# Altium integrated library TerminalBlocksPluggable_5.08mm.IntLib: 266 symbols (part 2 of 2)
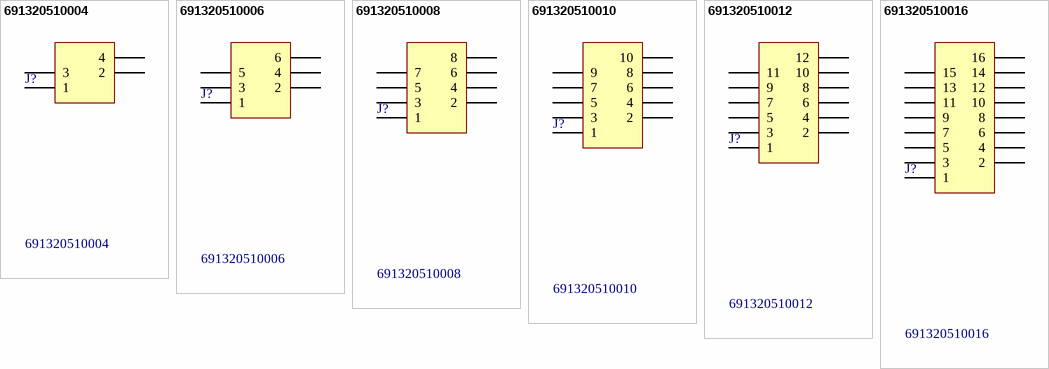
[diagram p25: symbols 691320510004 to 691320510016]

## 691320510012
designator J?
WR-TBL Terminal Blocks Serie 3205 - 5.08 mm with Flanges & Nut Type; Manufacturer: Würth Elektronik eiSos GmbH; ComponentLink1 Description: Manufacturer; ComponentLink2 Description: Datasheet; NoPins: 12; Created Date: 09 April 2014; partNo: 691320510012; ComponentLink1URL: http://www.we-online.com; ComponentLink2URL: http://katalog.we-online.de/em/datasheet/6913205100xx.pdf; Created by: Karrer Zheng; Value: 691320510012
footprint 691320510012 (5,08mm - PCB - Dual row - Staggered - Horizontal - Flanges - 12p)
pins: 1, 2, 3, 4, 5, 6, 7, 8, 9, 10, 11, 12

## 691320510016
designator J?
WR-TBL Terminal Blocks Serie 3205 - 5.08 mm with Flanges & Nut Type; Manufacturer: Würth Elektronik eiSos GmbH; ComponentLink1 Description: Manufacturer; ComponentLink2 Description: Datasheet; NoPins: 16; Created Date: 09 April 2014; partNo: 691320510016; ComponentLink1URL: http://www.we-online.com; ComponentLink2URL: http://katalog.we-online.de/em/datasheet/6913205100xx.pdf; Created by: Karrer Zheng; Value: 691320510016
footprint 691320510016 (5,08mm - PCB - Dual row - Staggered - Horizontal - Flanges - 16p)
pins: 1, 2, 3, 4, 5, 6, 7, 8, 9, 10, 11, 12, 13, 14, 15, 16


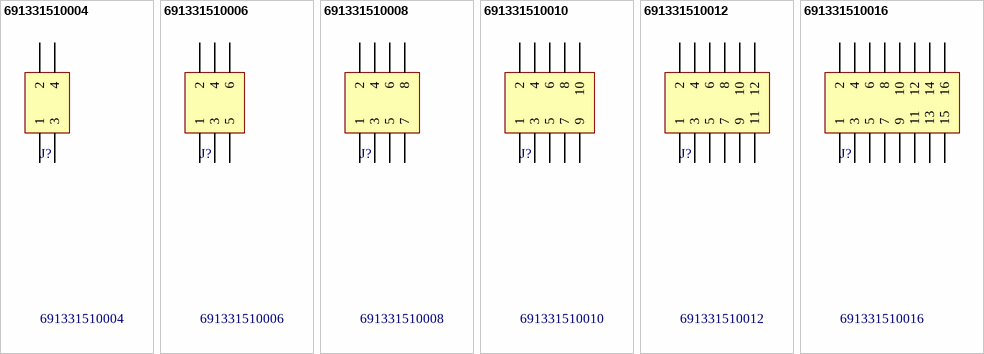
[diagram p11: symbols 691331510004 to 691331510016]

## 691331510004
designator J?
WR-TBL Terminal Blocks Serie 3315 - 5.08 mm; Manufacturer: Würth Elektronik eiSos GmbH; ComponentLink1 Description: Manufacturer; ComponentLink2 Description: Datasheet; NoPins: 04; Created Date: 31 March 2014; partNo: 691331510004; ComponentLink1URL: http://www.we-online.com; ComponentLink2URL: http://katalog.we-online.de/em/datasheet/6913315100xx.pdf; Created by: Karrer Zheng; Value: 691331510004
footprint 691331510004 (5,08mm - PCB - Dual row - Horizontal - 04p)
pins: 1, 2, 3, 4

## 691331510006
designator J?
WR-TBL Terminal Blocks Serie 3315 - 5.08 mm; Manufacturer: Würth Elektronik eiSos GmbH; ComponentLink1 Description: Manufacturer; ComponentLink2 Description: Datasheet; NoPins: 06; Created Date: 31 March 2014; partNo: 691331510006; ComponentLink1URL: http://www.we-online.com; ComponentLink2URL: http://katalog.we-online.de/em/datasheet/6913315100xx.pdf; Created by: Karrer Zheng; Value: 691331510006
footprint 691331510006 (5,08mm - PCB - Dual row - Horizontal - 06p)
pins: 1, 2, 3, 4, 5, 6

## 691331510008
designator J?
WR-TBL Terminal Blocks Serie 3315 - 5.08 mm; Manufacturer: Würth Elektronik eiSos GmbH; ComponentLink1 Description: Manufacturer; ComponentLink2 Description: Datasheet; NoPins: 08; Created Date: 31 March 2014; partNo: 691331510008; ComponentLink1URL: http://www.we-online.com; ComponentLink2URL: http://katalog.we-online.de/em/datasheet/6913315100xx.pdf; Created by: Karrer Zheng; Value: 691331510008
footprint 691331510008 (5,08mm - PCB - Dual row - Horizontal - 08p)
pins: 1, 2, 3, 4, 5, 6, 7, 8

## 691331510010
designator J?
WR-TBL Terminal Blocks Serie 3315 - 5.08 mm; Manufacturer: Würth Elektronik eiSos GmbH; ComponentLink1 Description: Manufacturer; ComponentLink2 Description: Datasheet; NoPins: 10; Created Date: 31 March 2014; partNo: 691331510010; ComponentLink1URL: http://www.we-online.com; ComponentLink2URL: http://katalog.we-online.de/em/datasheet/6913315100xx.pdf; Created by: Karrer Zheng; Value: 691331510010
footprint 691331510010 (5,08mm - PCB - Dual row - Horizontal - 10p)
pins: 1, 2, 3, 4, 5, 6, 7, 8, 9, 10

## 691331510012
designator J?
WR-TBL Terminal Blocks Serie 3315 - 5.08 mm; Manufacturer: Würth Elektronik eiSos GmbH; ComponentLink1 Description: Manufacturer; ComponentLink2 Description: Datasheet; NoPins: 12; Created Date: 31 March 2014; partNo: 691331510012; ComponentLink1URL: http://www.we-online.com; ComponentLink2URL: http://katalog.we-online.de/em/datasheet/6913315100xx.pdf; Created by: Karrer Zheng; Value: 691331510012
footprint 691331510012 (5,08mm - PCB - Dual row - Horizontal - 12p)
pins: 1, 2, 3, 4, 5, 6, 7, 8, 9, 10, 11, 12

## 691331510016
designator J?
WR-TBL Terminal Blocks Serie 3315 - 5.08 mm; Manufacturer: Würth Elektronik eiSos GmbH; ComponentLink1 Description: Manufacturer; ComponentLink2 Description: Datasheet; NoPins: 16; Created Date: 31 March 2014; partNo: 691331510016; ComponentLink1URL: http://www.we-online.com; ComponentLink2URL: http://katalog.we-online.de/em/datasheet/6913315100xx.pdf; Created by: Karrer Zheng; Value: 691331510016
footprint 691331510016 (5,08mm - PCB - Dual row - Horizontal - 16p)
pins: 1, 2, 3, 4, 5, 6, 7, 8, 9, 10, 11, 12, 13, 14, 15, 16


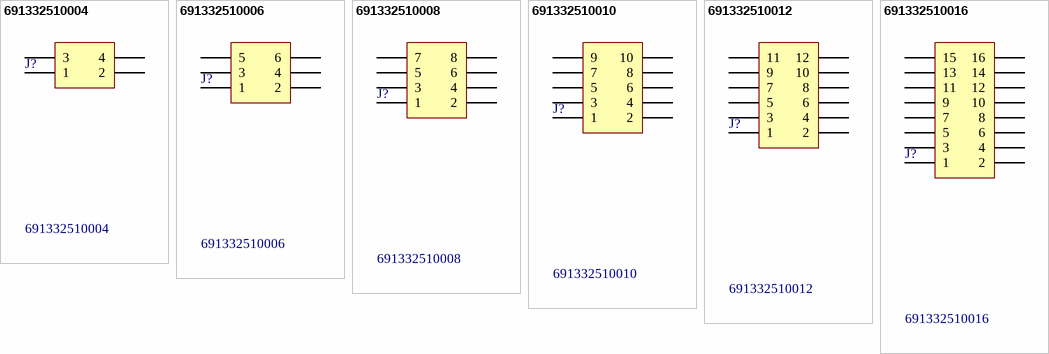
[diagram p12: symbols 691332510004 to 691332510016]

## 691332510004
designator J?
WR-TBL Terminal Blocks Serie 3325 - 5.08 mm with Flanges & Nut Type; Manufacturer: Würth Elektronik eiSos GmbH; ComponentLink1 Description: Manufacturer; ComponentLink2 Description: Datasheet; NoPins: 04; Created Date: 09 April 2014; partNo: 691332510004; ComponentLink1URL: http://www.we-online.com; ComponentLink2URL: http://katalog.we-online.de/em/datasheet/6913325100xx.pdf; Created by: Karrer Zheng; Value: 691332510004
footprint 691332510004 (5,08mm - PCB - Dual row - Horizontal - Flanges - 04p)
pins: 1, 2, 3, 4

## 691332510006
designator J?
WR-TBL Terminal Blocks Serie 3325 - 5.08 mm with Flanges & Nut Type; Manufacturer: Würth Elektronik eiSos GmbH; ComponentLink1 Description: Manufacturer; ComponentLink2 Description: Datasheet; NoPins: 06; Created Date: 09 April 2014; partNo: 691332510006; ComponentLink1URL: http://www.we-online.com; ComponentLink2URL: http://katalog.we-online.de/em/datasheet/6913325100xx.pdf; Created by: Karrer Zheng; Value: 691332510006
footprint 691332510006 (5,08mm - PCB - Dual row - Horizontal - Flanges - 06p)
pins: 1, 2, 3, 4, 5, 6

## 691332510008
designator J?
WR-TBL Terminal Blocks Serie 3325 - 5.08 mm with Flanges & Nut Type; Manufacturer: Würth Elektronik eiSos GmbH; ComponentLink1 Description: Manufacturer; ComponentLink2 Description: Datasheet; NoPins: 08; Created Date: 09 April 2014; partNo: 691332510008; ComponentLink1URL: http://www.we-online.com; ComponentLink2URL: http://katalog.we-online.de/em/datasheet/6913325100xx.pdf; Created by: Karrer Zheng; Value: 691332510008
footprint 691332510008 (5,08mm - PCB - Dual row - Horizontal - Flanges - 08p)
pins: 1, 2, 3, 4, 5, 6, 7, 8

## 691332510010
designator J?
WR-TBL Terminal Blocks Serie 3325 - 5.08 mm with Flanges & Nut Type; Manufacturer: Würth Elektronik eiSos GmbH; ComponentLink1 Description: Manufacturer; ComponentLink2 Description: Datasheet; NoPins: 10; Created Date: 09 April 2014; partNo: 691332510010; ComponentLink1URL: http://www.we-online.com; ComponentLink2URL: http://katalog.we-online.de/em/datasheet/6913325100xx.pdf; Created by: Karrer Zheng; Value: 691332510010
footprint 691332510010 (5,08mm - PCB - Dual row - Horizontal - Flanges - 10p)
pins: 1, 2, 3, 4, 5, 6, 7, 8, 9, 10

## 691332510012
designator J?
WR-TBL Terminal Blocks Serie 3325 - 5.08 mm with Flanges & Nut Type; Manufacturer: Würth Elektronik eiSos GmbH; ComponentLink1 Description: Manufacturer; ComponentLink2 Description: Datasheet; NoPins: 12; Created Date: 09 April 2014; partNo: 691332510012; ComponentLink1URL: http://www.we-online.com; ComponentLink2URL: http://katalog.we-online.de/em/datasheet/6913325100xx.pdf; Created by: Karrer Zheng; Value: 691332510012
footprint 691332510012 (5,08mm - PCB - Dual row - Horizontal - Flanges - 12p)
pins: 1, 2, 3, 4, 5, 6, 7, 8, 9, 10, 11, 12

## 691332510016
designator J?
WR-TBL Terminal Blocks Serie 3325 - 5.08 mm with Flanges & Nut Type; Manufacturer: Würth Elektronik eiSos GmbH; ComponentLink1 Description: Manufacturer; ComponentLink2 Description: Datasheet; NoPins: 16; Created Date: 09 April 2014; partNo: 691332510016; ComponentLink1URL: http://www.we-online.com; ComponentLink2URL: http://katalog.we-online.de/em/datasheet/6913325100xx.pdf; Created by: Karrer Zheng; Value: 691332510016
footprint 691332510016 (5,08mm - PCB - Dual row - Horizontal - Flanges - 16p)
pins: 1, 2, 3, 4, 5, 6, 7, 8, 9, 10, 11, 12, 13, 14, 15, 16


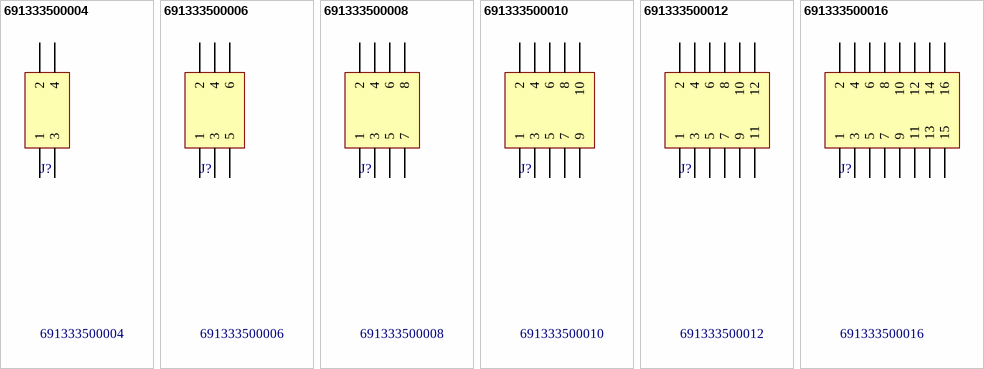
[diagram p13: symbols 691333500004 to 691333500016]

## 691333500004
designator J?
WR-TBL Terminal Blocks Serie 3335 - 5.08 mm; Manufacturer: Würth Elektronik eiSos GmbH; ComponentLink1 Description: Manufacturer; ComponentLink2 Description: Datasheet; NoPins: 04; Created Date: 9 January 2014; partNo: 691333500004; ComponentLink1URL: http://www.we-online.com; ComponentLink2URL: http://katalog.we-online.de/em/datasheet/6913335000xx.pdf; Created by: Karrer Zheng; Value: 691333500004
footprint 691333500004 (5,08mm - PCB - Dual row - Vertical - 04p)
pins: 1, 2, 3, 4

## 691333500006
designator J?
WR-TBL Terminal Blocks Serie 3335 - 5.08 mm; Manufacturer: Würth Elektronik eiSos GmbH; ComponentLink1 Description: Manufacturer; ComponentLink2 Description: Datasheet; NoPins: 06; Created Date: 9 January 2014; partNo: 691333500006; ComponentLink1URL: http://www.we-online.com; ComponentLink2URL: http://katalog.we-online.de/em/datasheet/6913335000xx.pdf; Created by: Karrer Zheng; Value: 691333500006
footprint 691333500006 (5,08mm - PCB - Dual row - Vertical - 06p)
pins: 1, 2, 3, 4, 5, 6

## 691333500008
designator J?
WR-TBL Terminal Blocks Serie 3335 - 5.08 mm; Manufacturer: Würth Elektronik eiSos GmbH; ComponentLink1 Description: Manufacturer; ComponentLink2 Description: Datasheet; NoPins: 08; Created Date: 9 January 2014; partNo: 691333500008; ComponentLink1URL: http://www.we-online.com; ComponentLink2URL: http://katalog.we-online.de/em/datasheet/6913335000xx.pdf; Created by: Karrer Zheng; Value: 691333500008
footprint 691333500008 (5,08mm - PCB - Dual row - Vertical - 08p)
pins: 1, 2, 3, 4, 5, 6, 7, 8

## 691333500010
designator J?
WR-TBL Terminal Blocks Serie 3335 - 5.08 mm; Manufacturer: Würth Elektronik eiSos GmbH; ComponentLink1 Description: Manufacturer; ComponentLink2 Description: Datasheet; NoPins: 10; Created Date: 9 January 2014; partNo: 691333500010; ComponentLink1URL: http://www.we-online.com; ComponentLink2URL: http://katalog.we-online.de/em/datasheet/6913335000xx.pdf; Created by: Karrer Zheng; Value: 691333500010
footprint 691333500010 (5,08mm - PCB - Dual row - Vertical - 10p)
pins: 1, 2, 3, 4, 5, 6, 7, 8, 9, 10

## 691333500012
designator J?
WR-TBL Terminal Blocks Serie 3335 - 5.08 mm; Manufacturer: Würth Elektronik eiSos GmbH; ComponentLink1 Description: Manufacturer; ComponentLink2 Description: Datasheet; NoPins: 12; Created Date: 9 January 2014; partNo: 691333500012; ComponentLink1URL: http://www.we-online.com; ComponentLink2URL: http://katalog.we-online.de/em/datasheet/6913335000xx.pdf; Created by: Karrer Zheng; Value: 691333500012
footprint 691333500012 (5,08mm - PCB - Dual row - Vertical - 12p)
pins: 1, 2, 3, 4, 5, 6, 7, 8, 9, 10, 11, 12

## 691333500016
designator J?
WR-TBL Terminal Blocks Serie 3335 - 5.08 mm; Manufacturer: Würth Elektronik eiSos GmbH; ComponentLink1 Description: Manufacturer; ComponentLink2 Description: Datasheet; NoPins: 16; Created Date: 9 January 2014; partNo: 691333500016; ComponentLink1URL: http://www.we-online.com; ComponentLink2URL: http://katalog.we-online.de/em/datasheet/6913335000xx.pdf; Created by: Karrer Zheng; Value: 691333500016
footprint 691333500016 (5,08mm - PCB - Dual row - Vertical - 16p)
pins: 1, 2, 3, 4, 5, 6, 7, 8, 9, 10, 11, 12, 13, 14, 15, 16


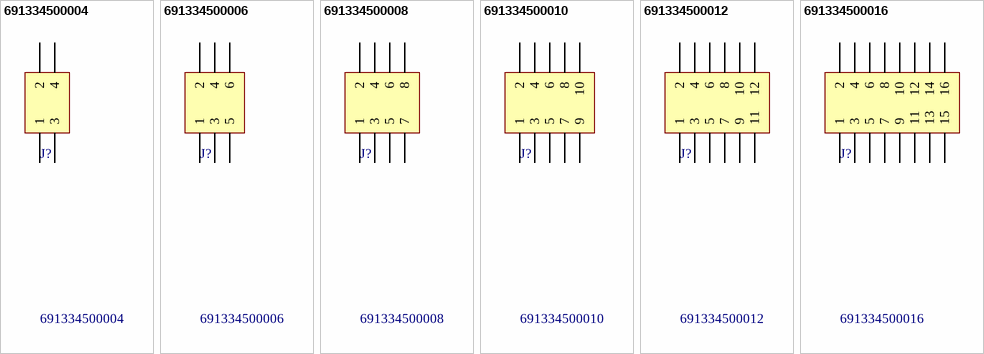
[diagram p14: symbols 691334500004 to 691334500016]

## 691334500004
designator J?
WR-TBL Terminal Blocks Serie 3345 - 5.08 mm with Flanges & Nut Type; Manufacturer: Würth Elektronik eiSos GmbH; ComponentLink1 Description: Manufacturer; ComponentLink2 Description: Datasheet; NoPins: 04; Created Date: 25 March 2014; partNo: 691334500004; ComponentLink1URL: http://www.we-online.com; ComponentLink2URL: http://katalog.we-online.de/em/datasheet/6913345000xx.pdf; Created by: Karrer Zheng; Value: 691334500004
footprint 691334500004 (5,08mm - PCB - Dual row - Vertical - Flanges - 04p)
pins: 1, 2, 3, 4

## 691334500006
designator J?
WR-TBL Terminal Blocks Serie 3345 - 5.08 mm with Flanges & Nut Type; Manufacturer: Würth Elektronik eiSos GmbH; ComponentLink1 Description: Manufacturer; ComponentLink2 Description: Datasheet; NoPins: 06; Created Date: 25 March 2014; partNo: 691334500006; ComponentLink1URL: http://www.we-online.com; ComponentLink2URL: http://katalog.we-online.de/em/datasheet/6913345000xx.pdf; Created by: Karrer Zheng; Value: 691334500006
footprint 691334500006 (5,08mm - PCB - Dual row - Vertical - Flanges - 06p)
pins: 1, 2, 3, 4, 5, 6

## 691334500008
designator J?
WR-TBL Terminal Blocks Serie 3345 - 5.08 mm with Flanges & Nut Type; Manufacturer: Würth Elektronik eiSos GmbH; ComponentLink1 Description: Manufacturer; ComponentLink2 Description: Datasheet; NoPins: 08; Created Date: 25 March 2014; partNo: 691334500008; ComponentLink1URL: http://www.we-online.com; ComponentLink2URL: http://katalog.we-online.de/em/datasheet/6913345000xx.pdf; Created by: Karrer Zheng; Value: 691334500008
footprint 691334500008 (5,08mm - PCB - Dual row - Vertical - Flanges - 04p)
pins: 1, 2, 3, 4, 5, 6, 7, 8

## 691334500010
designator J?
WR-TBL Terminal Blocks Serie 3345 - 5.08 mm with Flanges & Nut Type; Manufacturer: Würth Elektronik eiSos GmbH; ComponentLink1 Description: Manufacturer; ComponentLink2 Description: Datasheet; NoPins: 10; Created Date: 25 March 2014; partNo: 691334500010; ComponentLink1URL: http://www.we-online.com; ComponentLink2URL: http://katalog.we-online.de/em/datasheet/6913345000xx.pdf; Created by: Karrer Zheng; Value: 691334500010
footprint 691334500010 (5,08mm - PCB - Dual row - Vertical - Flanges - 10p)
pins: 1, 2, 3, 4, 5, 6, 7, 8, 9, 10

## 691334500012
designator J?
WR-TBL Terminal Blocks Serie 3345 - 5.08 mm with Flanges & Nut Type; Manufacturer: Würth Elektronik eiSos GmbH; ComponentLink1 Description: Manufacturer; ComponentLink2 Description: Datasheet; NoPins: 12; Created Date: 25 March 2014; partNo: 691334500012; ComponentLink1URL: http://www.we-online.com; ComponentLink2URL: http://katalog.we-online.de/em/datasheet/6913345000xx.pdf; Created by: Karrer Zheng; Value: 691334500012
footprint 691334500012 (5,08mm - PCB - Dual row - Vertical - Flanges - 12p)
pins: 1, 2, 3, 4, 5, 6, 7, 8, 9, 10, 11, 12

## 691334500016
designator J?
WR-TBL Terminal Blocks Serie 3345 - 5.08 mm with Flanges & Nut Type; Manufacturer: Würth Elektronik eiSos GmbH; ComponentLink1 Description: Manufacturer; ComponentLink2 Description: Datasheet; NoPins: 16; Created Date: 25 March 2014; partNo: 691334500016; ComponentLink1URL: http://www.we-online.com; ComponentLink2URL: http://katalog.we-online.de/em/datasheet/6913345000xx.pdf; Created by: Karrer Zheng; Value: 691334500016
footprint 691334500016 (5,08mm - PCB - Dual row - Vertical - Flanges - 16p)
pins: 1, 2, 3, 4, 5, 6, 7, 8, 9, 10, 11, 12, 13, 14, 15, 16


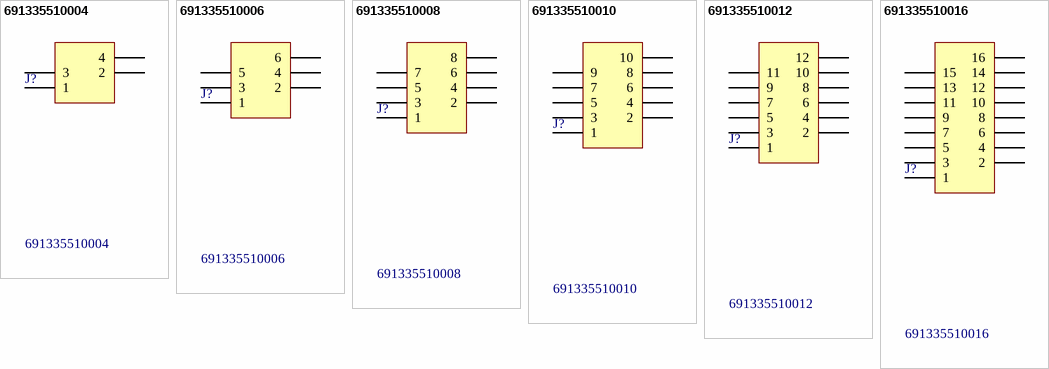
[diagram p15: symbols 691335510004 to 691335510016]

## 691335510004
designator J?
WR-TBL Terminal Blocks Serie 3355 - 5.08 mm; Manufacturer: Würth Elektronik eiSos GmbH; ComponentLink1 Description: Manufacturer; ComponentLink2 Description: Datasheet; NoPins: 04; Created Date: 09 April 2014; partNo: 691335510004; ComponentLink1URL: http://www.we-online.com; ComponentLink2URL: http://katalog.we-online.de/em/datasheet/6913355100xx.pdf; Created by: Karrer Zheng; Value: 691335510004
footprint 691335510004 (5,08mm - PCB - Dual row - Staggered - Horizontal - Open - 04p)
pins: 1, 2, 3, 4

## 691335510006
designator J?
WR-TBL Terminal Blocks Serie 3355 - 5.08 mm; Manufacturer: Würth Elektronik eiSos GmbH; ComponentLink1 Description: Manufacturer; ComponentLink2 Description: Datasheet; NoPins: 06; Created Date: 09 April 2014; partNo: 691335510006; ComponentLink1URL: http://www.we-online.com; ComponentLink2URL: http://katalog.we-online.de/em/datasheet/6913355100xx.pdf; Created by: Karrer Zheng; Value: 691335510006
footprint 691335510006 (5,08mm - PCB - Dual row - Staggered - Horizontal - Open - 06p)
pins: 1, 2, 3, 4, 5, 6

## 691335510008
designator J?
WR-TBL Terminal Blocks Serie 3355 - 5.08 mm; Manufacturer: Würth Elektronik eiSos GmbH; ComponentLink1 Description: Manufacturer; ComponentLink2 Description: Datasheet; NoPins: 08; Created Date: 09 April 2014; partNo: 691335510008; ComponentLink1URL: http://www.we-online.com; ComponentLink2URL: http://katalog.we-online.de/em/datasheet/6913355100xx.pdf; Created by: Karrer Zheng; Value: 691335510008
footprint 691335510008 (5,08mm - PCB - Dual row - Staggered - Horizontal - Open - 08p)
pins: 1, 2, 3, 4, 5, 6, 7, 8

## 691335510010
designator J?
WR-TBL Terminal Blocks Serie 3355 - 5.08 mm; Manufacturer: Würth Elektronik eiSos GmbH; ComponentLink1 Description: Manufacturer; ComponentLink2 Description: Datasheet; NoPins: 10; Created Date: 09 April 2014; partNo: 691335510010; ComponentLink1URL: http://www.we-online.com; ComponentLink2URL: http://katalog.we-online.de/em/datasheet/6913355100xx.pdf; Created by: Karrer Zheng; Value: 691335510010
footprint 691335510010 (5,08mm - PCB - Dual row - Staggered - Horizontal - Open - 10p)
pins: 1, 2, 3, 4, 5, 6, 7, 8, 9, 10

## 691335510012
designator J?
WR-TBL Terminal Blocks Serie 3355 - 5.08 mm; Manufacturer: Würth Elektronik eiSos GmbH; ComponentLink1 Description: Manufacturer; ComponentLink2 Description: Datasheet; NoPins: 12; Created Date: 09 April 2014; partNo: 691335510012; ComponentLink1URL: http://www.we-online.com; ComponentLink2URL: http://katalog.we-online.de/em/datasheet/6913355100xx.pdf; Created by: Karrer Zheng; Value: 691335510012
footprint 691335510012 (5,08mm - PCB - Dual row - Staggered - Horizontal - Open - 12p)
pins: 1, 2, 3, 4, 5, 6, 7, 8, 9, 10, 11, 12

## 691335510016
designator J?
WR-TBL Terminal Blocks Serie 3355 - 5.08 mm; Manufacturer: Würth Elektronik eiSos GmbH; ComponentLink1 Description: Manufacturer; ComponentLink2 Description: Datasheet; NoPins: 16; Created Date: 09 April 2014; partNo: 691335510016; ComponentLink1URL: http://www.we-online.com; ComponentLink2URL: http://katalog.we-online.de/em/datasheet/6913355100xx.pdf; Created by: Karrer Zheng; Value: 691335510016
footprint 691335510016 (5,08mm - PCB - Dual row - Staggered - Horizontal - Open - 16p)
pins: 1, 2, 3, 4, 5, 6, 7, 8, 9, 10, 11, 12, 13, 14, 15, 16


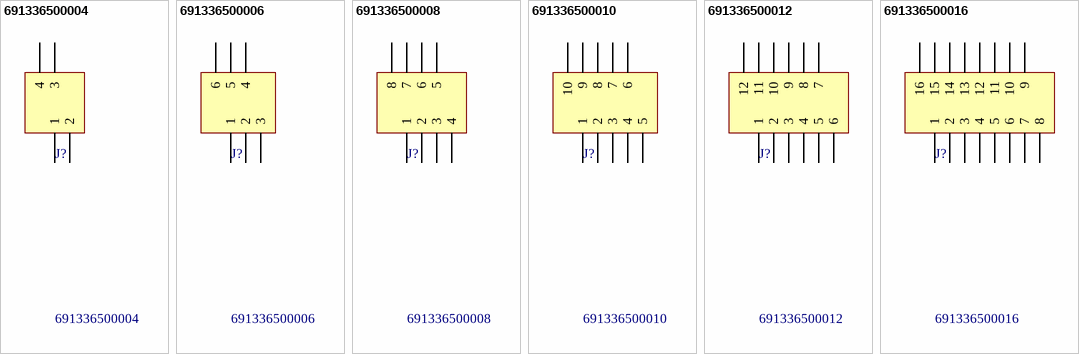
[diagram p16: symbols 691336500004 to 691336500016]

## 691336500004
designator J?
WR-TBL Terminal Blocks Serie 3365 - 5.08 mm; Manufacturer: Würth Elektronik eiSos GmbH; ComponentLink1 Description: Manufacturer; ComponentLink2 Description: Datasheet; NoPins: 04; Created Date: 9 January 2014; partNo: 691336500004; ComponentLink1URL: http://www.we-online.com; ComponentLink2URL: http://katalog.we-online.de/em/datasheet/6913365000xx.pdf; Created by: Karrer Zheng; Value: 691336500004
footprint 691336500004 (5,08mm - PCB - Dual row - Staggered - Vertical - Closed - 04p)
pins: 1, 2, 3, 4

## 691336500006
designator J?
WR-TBL Terminal Blocks Serie 3365 - 5.08 mm; Manufacturer: Würth Elektronik eiSos GmbH; ComponentLink1 Description: Manufacturer; ComponentLink2 Description: Datasheet; NoPins: 06; Created Date: 9 January 2014; partNo: 691336500006; ComponentLink1URL: http://www.we-online.com; ComponentLink2URL: http://katalog.we-online.de/em/datasheet/6913365000xx.pdf; Created by: Karrer Zheng; Value: 691336500006
footprint 691336500006 (5,08mm - PCB - Dual row - Staggered - Vertical - Closed - 06p)
pins: 1, 2, 3, 4, 5, 6

## 691336500008
designator J?
WR-TBL Terminal Blocks Serie 3365 - 5.08 mm; Manufacturer: Würth Elektronik eiSos GmbH; ComponentLink1 Description: Manufacturer; ComponentLink2 Description: Datasheet; NoPins: 08; Created Date: 9 January 2014; partNo: 691336500008; ComponentLink1URL: http://www.we-online.com; ComponentLink2URL: http://katalog.we-online.de/em/datasheet/6913365000xx.pdf; Created by: Karrer Zheng; Value: 691336500008
footprint 691336500008 (5,08mm - PCB - Dual row - Staggered - Vertical - Closed - 08p)
pins: 1, 2, 3, 4, 5, 6, 7, 8

## 691336500010
designator J?
WR-TBL Terminal Blocks Serie 3365 - 5.08 mm; Manufacturer: Würth Elektronik eiSos GmbH; ComponentLink1 Description: Manufacturer; ComponentLink2 Description: Datasheet; NoPins: 10; Created Date: 9 January 2014; partNo: 691336500010; ComponentLink1URL: http://www.we-online.com; ComponentLink2URL: http://katalog.we-online.de/em/datasheet/6913365000xx.pdf; Created by: Karrer Zheng; Value: 691336500010
footprint 691336500010 (5,08mm - PCB - Dual row - Staggered - Vertical - Closed - 10p)
pins: 1, 2, 3, 4, 5, 6, 7, 8, 9, 10

## 691336500012
designator J?
WR-TBL Terminal Blocks Serie 3365 - 5.08 mm; Manufacturer: Würth Elektronik eiSos GmbH; ComponentLink1 Description: Manufacturer; ComponentLink2 Description: Datasheet; NoPins: 12; Created Date: 9 January 2014; partNo: 691336500012; ComponentLink1URL: http://www.we-online.com; ComponentLink2URL: http://katalog.we-online.de/em/datasheet/6913365000xx.pdf; Created by: Karrer Zheng; Value: 691336500012
footprint 691336500012 (5,08mm - PCB - Dual row - Staggered - Vertical - Closed - 12p)
pins: 1, 2, 3, 4, 5, 6, 7, 8, 9, 10, 11, 12

## 691336500016
designator J?
WR-TBL Terminal Blocks Serie 3365 - 5.08 mm; Manufacturer: Würth Elektronik eiSos GmbH; ComponentLink1 Description: Manufacturer; ComponentLink2 Description: Datasheet; NoPins: 16; Created Date: 9 January 2014; partNo: 691336500016; ComponentLink1URL: http://www.we-online.com; ComponentLink2URL: http://katalog.we-online.de/em/datasheet/6913365000xx.pdf; Created by: Karrer Zheng; Value: 691336500016
footprint 691336500016 (5,08mm - PCB - Dual row - Staggered - Vertical - Closed - 16p)
pins: 1, 2, 3, 4, 5, 6, 7, 8, 9, 10, 11, 12, 13, 14, 15, 16


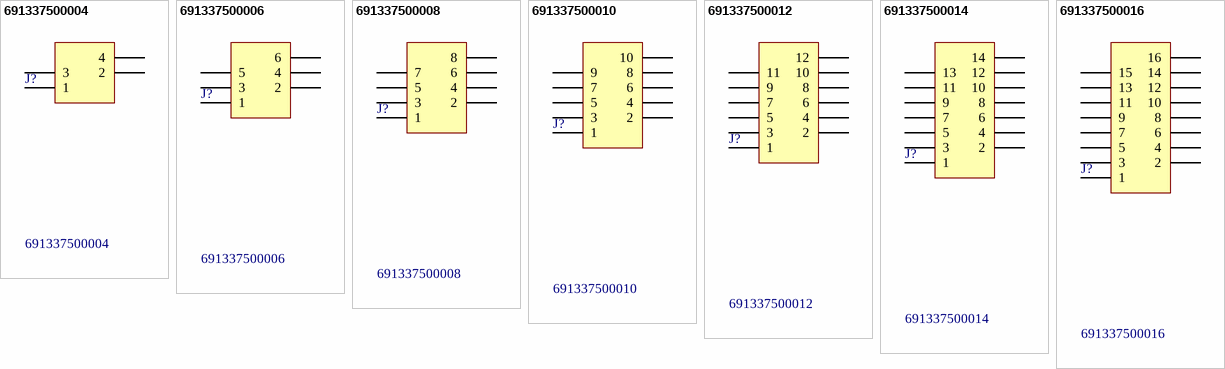
[diagram p17: symbols 691337500004 to 691337500016]

## 691337500004
designator J?
WR-TBL Terminal Blocks Serie 3375 - 5.08 mm with Flanges & Nut Type; Manufacturer: Würth Elektronik eiSos GmbH; ComponentLink1 Description: Manufacturer; ComponentLink2 Description: Datasheet; NoPins: 04; Created Date: 31 March 2014; partNo: 691337500004; ComponentLink1URL: http://www.we-online.com; ComponentLink2URL: http://katalog.we-online.de/em/datasheet/6913375000xx.pdf; Created by: Karrer Zheng; Value: 691337500004
footprint 691337500004 (5,08mm - PCB - Dual row - Staggered - Vertical - Flanges - 04p)
pins: 1, 2, 3, 4

## 691337500006
designator J?
WR-TBL Terminal Blocks Serie 3375 - 5.08 mm with Flanges & Nut Type; Manufacturer: Würth Elektronik eiSos GmbH; ComponentLink1 Description: Manufacturer; ComponentLink2 Description: Datasheet; NoPins: 06; Created Date: 31 March 2014; partNo: 691337500006; ComponentLink1URL: http://www.we-online.com; ComponentLink2URL: http://katalog.we-online.de/em/datasheet/6913375000xx.pdf; Created by: Karrer Zheng; Value: 691337500006
footprint 691337500006 (5,08mm - PCB - Dual row - Staggered - Vertical - Flanges - 06p)
pins: 1, 2, 3, 4, 5, 6

## 691337500008
designator J?
WR-TBL Terminal Blocks Serie 3375 - 5.08 mm with Flanges & Nut Type; Manufacturer: Würth Elektronik eiSos GmbH; ComponentLink1 Description: Manufacturer; ComponentLink2 Description: Datasheet; NoPins: 08; Created Date: 31 March 2014; partNo: 691337500008; ComponentLink1URL: http://www.we-online.com; ComponentLink2URL: http://katalog.we-online.de/em/datasheet/6913375000xx.pdf; Created by: Karrer Zheng; Value: 691337500008
footprint 691337500008 (5,08mm - PCB - Dual row - Staggered - Vertical - Flanges - 08p)
pins: 1, 2, 3, 4, 5, 6, 7, 8

## 691337500010
designator J?
WR-TBL Terminal Blocks Serie 3375 - 5.08 mm with Flanges & Nut Type; Manufacturer: Würth Elektronik eiSos GmbH; ComponentLink1 Description: Manufacturer; ComponentLink2 Description: Datasheet; NoPins: 10; Created Date: 31 March 2014; partNo: 691337500010; ComponentLink1URL: http://www.we-online.com; ComponentLink2URL: http://katalog.we-online.de/em/datasheet/6913375000xx.pdf; Created by: Karrer Zheng; Value: 691337500010
footprint 691337500010 (5,08mm - PCB - Dual row - Staggered - Vertical - Flanges - 10p)
pins: 1, 2, 3, 4, 5, 6, 7, 8, 9, 10

## 691337500012
designator J?
WR-TBL Terminal Blocks Serie 3375 - 5.08 mm with Flanges & Nut Type; Manufacturer: Würth Elektronik eiSos GmbH; ComponentLink1 Description: Manufacturer; ComponentLink2 Description: Datasheet; NoPins: 12; Created Date: 31 March 2014; partNo: 691337500012; ComponentLink1URL: http://www.we-online.com; ComponentLink2URL: http://katalog.we-online.de/em/datasheet/6913375000xx.pdf; Created by: Karrer Zheng; Value: 691337500012
footprint 691337500012 (5,08mm - PCB - Dual row - Staggered - Vertical - Flanges - 12p)
pins: 1, 2, 3, 4, 5, 6, 7, 8, 9, 10, 11, 12

## 691337500014
designator J?
WR-TBL Terminal Blocks Serie 3375 - 5.08 mm with Flanges & Nut Type; Manufacturer: Würth Elektronik eiSos GmbH; ComponentLink1 Description: Manufacturer; ComponentLink2 Description: Datasheet; NoPins: 14; Created Date: 31 March 2014; partNo: 691337500014; ComponentLink1URL: http://www.we-online.com; ComponentLink2URL: http://katalog.we-online.de/em/datasheet/6913375000xx.pdf; Created by: Karrer Zheng; Value: 691337500014
footprint 691337500014 (5,08mm - PCB - Dual row - Staggered - Vertical - Flanges - 14p)
pins: 1, 2, 3, 4, 5, 6, 7, 8, 9, 10, 11, 12, 13, 14

## 691337500016
designator J?
WR-TBL Terminal Blocks Serie 3375 - 5.08 mm with Flanges & Nut Type; Manufacturer: Würth Elektronik eiSos GmbH; ComponentLink1 Description: Manufacturer; ComponentLink2 Description: Datasheet; NoPins: 16; Created Date: 31 March 2014; partNo: 691337500016; ComponentLink1URL: http://www.we-online.com; ComponentLink2URL: http://katalog.we-online.de/em/datasheet/6913375000xx.pdf; Created by: Karrer Zheng; Value: 691337500016
footprint 691337500016 (5,08mm - PCB - Dual row - Staggered - Vertical - Flanges - 16p)
pins: 1, 2, 3, 4, 5, 6, 7, 8, 9, 10, 11, 12, 13, 14, 15, 16


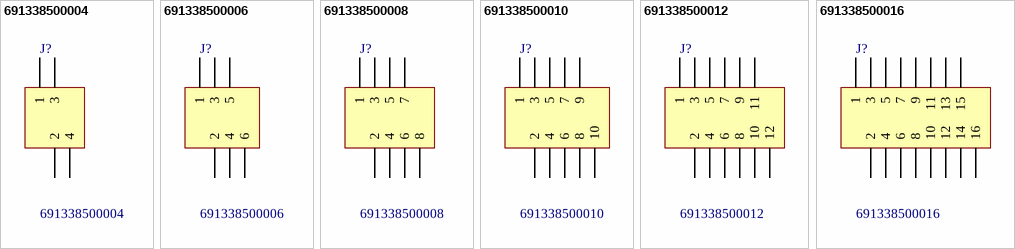
[diagram p18: symbols 691338500004 to 691338500016]

## 691338500004
designator J?
WR-TBL Terminal Blocks Serie 3385 - 5.08 mm; Manufacturer: Würth Elektronik eiSos GmbH; ComponentLink1 Description: Manufacturer; ComponentLink2 Description: Datasheet; NoPins: 04; Created Date: 25 March 2014; partNo: 691338500004; ComponentLink1URL: http://www.we-online.com; ComponentLink2URL: http://katalog.we-online.de/em/datasheet/6913385000xx.pdf; Created by: Karrer Zheng; Value: 691338500004
footprint 691338500004 (5,08mm - PCB - Dual row - Staggered - Vertical - Open - 04p)
pins: 1, 2, 3, 4

## 691338500006
designator J?
WR-TBL Terminal Blocks Serie 3385 - 5.08 mm; Manufacturer: Würth Elektronik eiSos GmbH; ComponentLink1 Description: Manufacturer; ComponentLink2 Description: Datasheet; NoPins: 06; Created Date: 25 March 2014; partNo: 691338500006; ComponentLink1URL: http://www.we-online.com; ComponentLink2URL: http://katalog.we-online.de/em/datasheet/6913385000xx.pdf; Created by: Karrer Zheng; Value: 691338500006
footprint 691338500006 (5,08mm - PCB - Dual row - Staggered - Vertical - Open - 06p)
pins: 1, 2, 3, 4, 5, 6

## 691338500008
designator J?
WR-TBL Terminal Blocks Serie 3385 - 5.08 mm; Manufacturer: Würth Elektronik eiSos GmbH; ComponentLink1 Description: Manufacturer; ComponentLink2 Description: Datasheet; NoPins: 08; Created Date: 25 March 2014; partNo: 691338500008; ComponentLink1URL: http://www.we-online.com; ComponentLink2URL: http://katalog.we-online.de/em/datasheet/6913385000xx.pdf; Created by: Karrer Zheng; Value: 691338500008
footprint 691338500008 (5,08mm - PCB - Dual row - Staggered - Vertical - Open - 08p)
pins: 1, 2, 3, 4, 5, 6, 7, 8

## 691338500010
designator J?
WR-TBL Terminal Blocks Serie 3385 - 5.08 mm; Manufacturer: Würth Elektronik eiSos GmbH; ComponentLink1 Description: Manufacturer; ComponentLink2 Description: Datasheet; NoPins: 10; Created Date: 25 March 2014; partNo: 691338500010; ComponentLink1URL: http://www.we-online.com; ComponentLink2URL: http://katalog.we-online.de/em/datasheet/6913385000xx.pdf; Created by: Karrer Zheng; Value: 691338500010
footprint 691338500010 (5,08mm - PCB - Dual row - Staggered - Vertical - Open - 10p)
pins: 1, 2, 3, 4, 5, 6, 7, 8, 9, 10

## 691338500012
designator J?
WR-TBL Terminal Blocks Serie 3385 - 5.08 mm; Manufacturer: Würth Elektronik eiSos GmbH; ComponentLink1 Description: Manufacturer; ComponentLink2 Description: Datasheet; NoPins: 12; Created Date: 25 March 2014; partNo: 691338500012; ComponentLink1URL: http://www.we-online.com; ComponentLink2URL: http://katalog.we-online.de/em/datasheet/6913385000xx.pdf; Created by: Karrer Zheng; Value: 691338500012
footprint 691338500012 (5,08mm - PCB - Dual row - Staggered - Vertical - Open - 12p)
pins: 1, 2, 3, 4, 5, 6, 7, 8, 9, 10, 11, 12

## 691338500016
designator J?
WR-TBL Terminal Blocks Serie 3385 - 5.08 mm; Manufacturer: Würth Elektronik eiSos GmbH; ComponentLink1 Description: Manufacturer; ComponentLink2 Description: Datasheet; NoPins: 16; Created Date: 25 March 2014; partNo: 691338500016; ComponentLink1URL: http://www.we-online.com; ComponentLink2URL: http://katalog.we-online.de/em/datasheet/6913385000xx.pdf; Created by: Karrer Zheng; Value: 691338500016
footprint 691338500016 (5,08mm - PCB - Dual row - Staggered - Vertical - Open - 16p)
pins: 1, 2, 3, 4, 5, 6, 7, 8, 9, 10, 11, 12, 13, 14, 15, 16


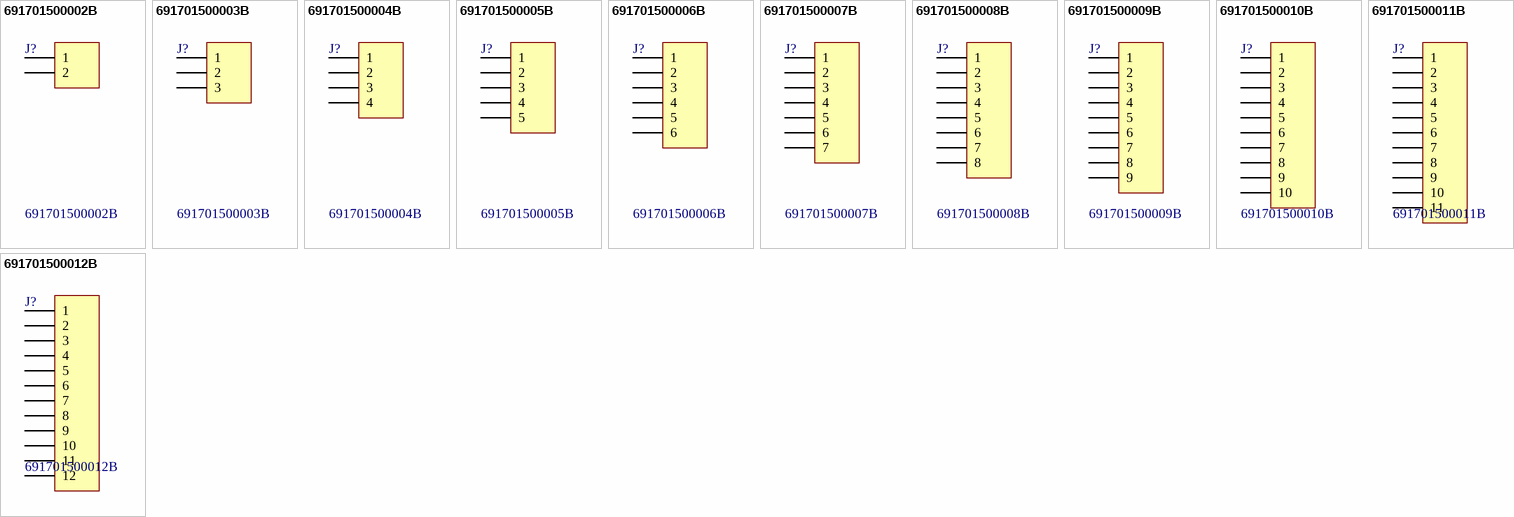
[diagram p19: symbols 691701500002B to 691701500012B]

## 691701500002B
designator J?
WR-TBL Terminal Blocks Serie 7015 B - 5.08 mm THR Type; Manufacturer: Würth Elektronik eiSos GmbH; ComponentLink1 Description: Manufacturer; ComponentLink2 Description: Datasheet; NoPins: 02; Created Date: 25 March 2014; partNo: 691701500002B; ComponentLink1URL: http://www.we-online.com; ComponentLink2URL: http://katalog.we-online.de/em/datasheet/6917015000xxB.pdf; Created by: Karrer Zheng; Value: 691701500002B
footprint 691701500002B (THR - 5,08mm - PCB Vertical Open - 02p)
pins: 1, 2

## 691701500003B
designator J?
WR-TBL Terminal Blocks Serie 7015 B - 5.08 mm THR Type; Manufacturer: Würth Elektronik eiSos GmbH; ComponentLink1 Description: Manufacturer; ComponentLink2 Description: Datasheet; NoPins: 03; Created Date: 25 March 2014; partNo: 691701500003B; ComponentLink1URL: http://www.we-online.com; ComponentLink2URL: http://katalog.we-online.de/em/datasheet/6917015000xxB.pdf; Created by: Karrer Zheng; Value: 691701500003B
footprint 691701500003B (THR - 5,08mm - PCB Vertical Open - 03p)
pins: 1, 2, 3

## 691701500004B
designator J?
WR-TBL Terminal Blocks Serie 7015 B - 5.08 mm THR Type; Manufacturer: Würth Elektronik eiSos GmbH; ComponentLink1 Description: Manufacturer; ComponentLink2 Description: Datasheet; NoPins: 04; Created Date: 25 March 2014; partNo: 691701500004B; ComponentLink1URL: http://www.we-online.com; ComponentLink2URL: http://katalog.we-online.de/em/datasheet/6917015000xxB.pdf; Created by: Karrer Zheng; Value: 691701500004B
footprint 691701500004B (THR - 5,08mm - PCB Vertical Open - 04p)
pins: 1, 2, 3, 4

## 691701500005B
designator J?
WR-TBL Terminal Blocks Serie 7015 B - 5.08 mm THR Type; Manufacturer: Würth Elektronik eiSos GmbH; ComponentLink1 Description: Manufacturer; ComponentLink2 Description: Datasheet; NoPins: 05; Created Date: 25 March 2014; partNo: 691701500005B; ComponentLink1URL: http://www.we-online.com; ComponentLink2URL: http://katalog.we-online.de/em/datasheet/6917015000xxB.pdf; Created by: Karrer Zheng; Value: 691701500005B
footprint 691701500005B (THR - 5,08mm - PCB Vertical Open - 05p)
pins: 1, 2, 3, 4, 5

## 691701500006B
designator J?
WR-TBL Terminal Blocks Serie 7015 B - 5.08 mm THR Type; Manufacturer: Würth Elektronik eiSos GmbH; ComponentLink1 Description: Manufacturer; ComponentLink2 Description: Datasheet; NoPins: 06; Created Date: 25 March 2014; partNo: 691701500006B; ComponentLink1URL: http://www.we-online.com; ComponentLink2URL: http://katalog.we-online.de/em/datasheet/6917015000xxB.pdf; Created by: Karrer Zheng; Value: 691701500006B
footprint 691701500006B (THR - 5,08mm - PCB Vertical Open - 06p)
pins: 1, 2, 3, 4, 5, 6
